# Altium schematic symbol library My Library.SchLib: 1211 symbols (part 6 of 12)
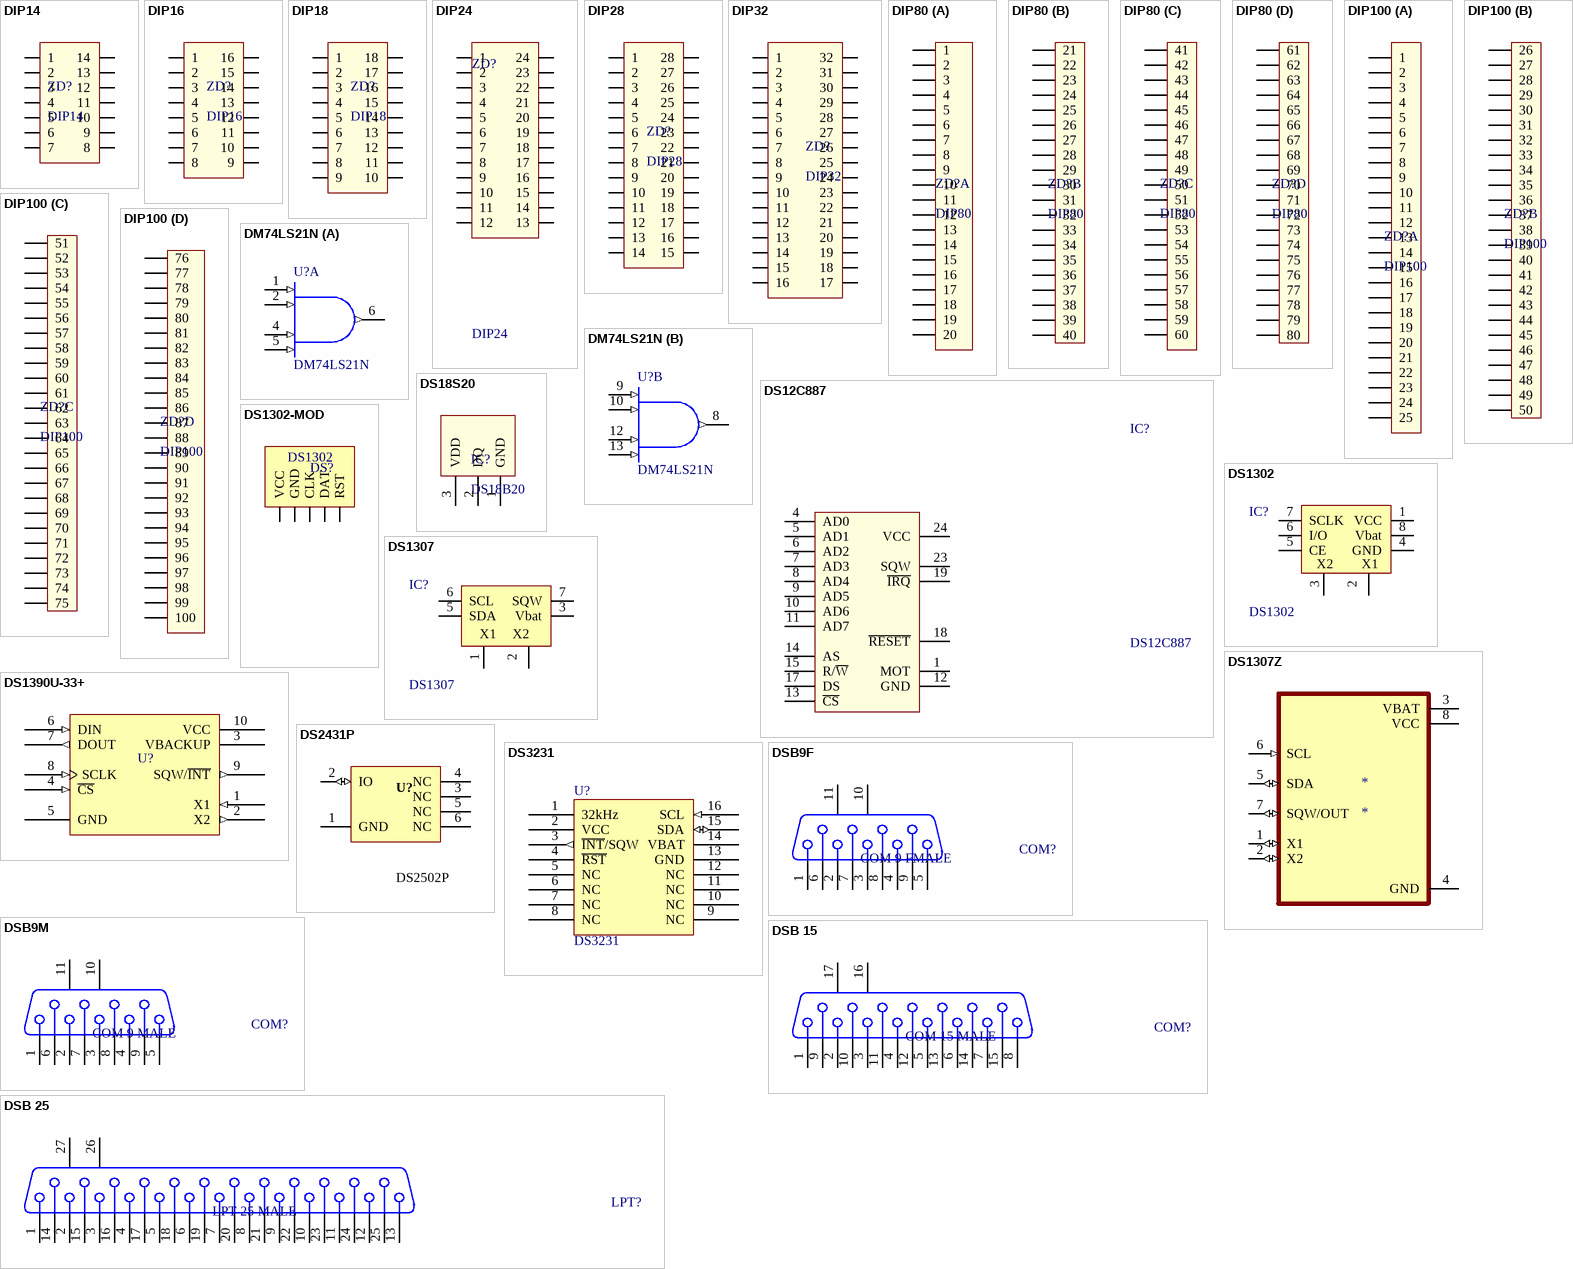
[diagram p77: symbols DIP14 to DSB 25]

## DSB 25
designator LPT?, comment LPT 25 MALE
LPT 25; PackageDocument: U; Positions: 25; Gender: Receptacle; Value: LPT 25; Published: 15-Jun-2001; LatestRevisionDate: 17-Jul-2002; LatestRevisionNote: Re-released for DXP Platform.; DatasheetDocument: 19-Mar-1999; PackageReference: 787202; Publisher: Altium Limited; Orientation: Right Angle
footprint DSB 25-F (LPT FMALE - D Subminiature; 25 Position; Right Angle; Pitch 1.385 mm)
signal-integrity model Connector
footprint DSB 25F-SM (25 pin, connector LPT)
footprint DSB 25-M (LPT MALE D Subminiature; 25 Position; Right Angle; Pitch 1.385 mm)
pins: 1, 2, 3, 4, 5, 6, 7, 8, 9, 10, 11, 12, 13, 14, 15, 16, 17, 18, 19, 20, 21, 22, 23, 24, 25, 26 MH1, 27 MH2

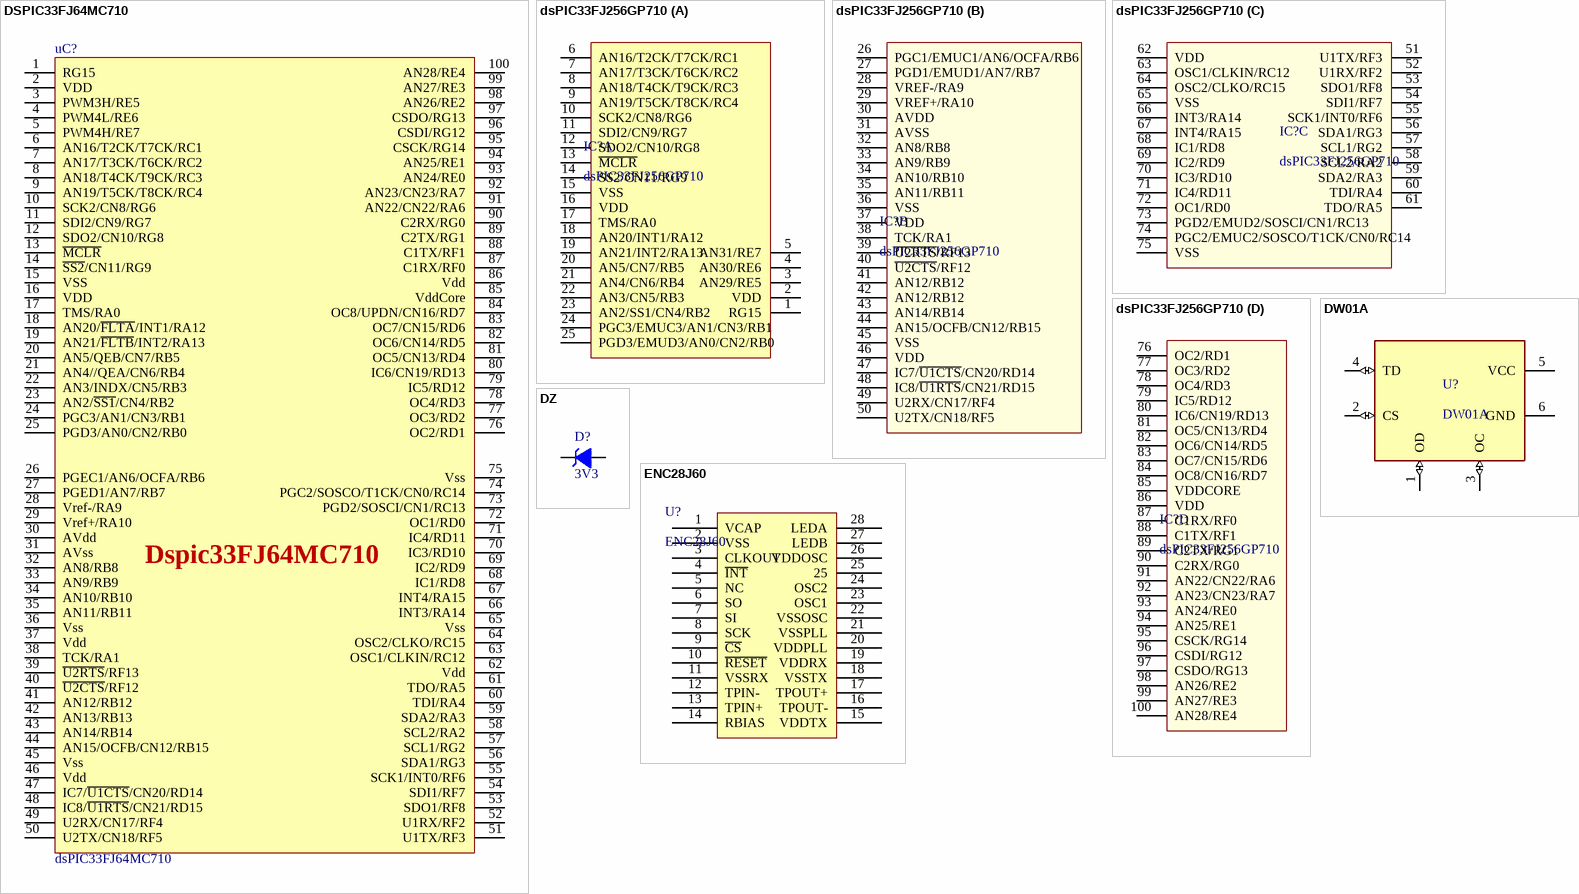
[diagram p33: symbols DSPIC33FJ64MC710 to ENC28J60]

## DSPIC33FJ64MC710
designator uC?, comment dsPIC33FJ64MC710
dsPIC33FJ64/128/256_MC710
footprint SQFP12X12-100(N)
footprint SQFP14X14-100(N)
footprint TQFP-100-12X12 (Shrink QFP, 100-Leads, Body 12x12mm, Pitch 0.4mm, IPC High Density)
pins: 1 RG15, 2 VDD, 3 PWM3H/RE5, 4 PWM4L/RE6, 5 PWM4H/RE7, 6 AN16/T2CK/T7CK/RC1, 7 AN17/T3CK/T6CK/RC2, 8 AN18/T4CK/T9CK/RC3, 9 AN19/T5CK/T8CK/RC4, 10 SCK2/CN8/RG6, 11 SDI2/CN9/RG7, 12 SDO2/CN10/RG8, 13 ~{MCLR}, 14 ~{SS2}/CN11/RG9, 15 VSS, 16 VDD, 17 TMS/RA0, 18 AN20/~{FLTA}/INT1/RA12, 19 AN21/~{FLTB}/INT2/RA13, 20 AN5/QEB/CN7/RB5, 21 AN4//QEA/CN6/RB4, 22 AN3/INDX/CN5/RB3, 23 AN2/~{SS1}/CN4/RB2, 24 PGC3/AN1/CN3/RB1, 25 PGD3/AN0/CN2/RB0, 26 PGEC1/AN6/OCFA/RB6, 27 PGED1/AN7/RB7, 28 Vref-/RA9, 29 Vref+/RA10, 30 AVdd, 31 AVss, 32 AN8/RB8, 33 AN9/RB9, 34 AN10/RB10, 35 AN11/RB11, 36 Vss, 37 Vdd, 38 TCK/RA1, 39 ~{U2RTS}/RF13, 40 ~{U2CTS}/RF12, 41 AN12/RB12, 42 AN13/RB13, 43 AN14/RB14, 44 AN15/OCFB/CN12/RB15, 45 Vss, 46 Vdd, 47 IC7/~{U1CTS}/CN20/RD14, 48 IC8/~{U1RTS}/CN21/RD15, 49 U2RX/CN17/RF4, 50 U2TX/CN18/RF5, 51 U1TX/RF3, 52 U1RX/RF2, 53 SDO1/RF8, 54 SDI1/RF7, 55 SCK1/INT0/RF6, 56 SDA1/RG3, 57 SCL1/RG2, 58 SCL2/RA2, 59 SDA2/RA3, 60 TDI/RA4, 61 TDO/RA5, 62 Vdd, 63 OSC1/CLKIN/RC12, 64 OSC2/CLKO/RC15, 65 Vss, 66 INT3/RA14, 67 INT4/RA15, 68 IC1/RD8, 69 IC2/RD9, 70 IC3/RD10, 71 IC4/RD11, 72 OC1/RD0, 73 PGD2/SOSCI/CN1/RC13, 74 PGC2/SOSCO/T1CK/CN0/RC14, 75 Vss, 76 OC2/RD1, 77 OC3/RD2, 78 OC4/RD3, 79 IC5/RD12, 80 IC6/CN19/RD13, 81 OC5/CN13/RD4, 82 OC6/CN14/RD5, 83 OC7/CN15/RD6, 84 OC8/UPDN/CN16/RD7, 85 VddCore, 86 Vdd, 87 C1RX/RF0, 88 C1TX/RF1, 89 C2TX/RG1, 90 C2RX/RG0, 91 AN22/CN22/RA6, 92 AN23/CN23/RA7, 93 AN24/RE0, 94 AN25/RE1, 95 CSCK/RG14, 96 CSDI/RG12, 97 CSDO/RG13, 98 AN26/RE2, 99 AN27/RE3, 100 AN28/RE4
text: Dspic33FJ64MC710

## dsPIC33FJ256GP710
designator IC?
PIC33FJ256GP710; Value: DIP100
footprint TQFP100L (TQFP, 100-Leads, Body 14.00x14.00mm, Pitch 0.50mm, IPC High Density)
part A pins: 1 RG15, 2 VDD, 3 AN29/RE5, 4 AN30/RE6, 5 AN31/RE7, 6 AN16/T2CK/T7CK/RC1, 7 AN17/T3CK/T6CK/RC2, 8 AN18/T4CK/T9CK/RC3, 9 AN19/T5CK/T8CK/RC4, 10 SCK2/CN8/RG6, 11 SDI2/CN9/RG7, 12 SDO2/CN10/RG8, 13 ~{MCLR}, 14 SS2/CN11/RG9, 15 VSS, 16 VDD, 17 TMS/RA0, 18 AN20/INT1/RA12, 19 AN21/INT2/RA13, 20 AN5/CN7/RB5, 21 AN4/CN6/RB4, 22 AN3/CN5/RB3, 23 AN2/SS1/CN4/RB2, 24 PGC3/EMUC3/AN1/CN3/RB1, 25 PGD3/EMUD3/AN0/CN2/RB0
part B pins: 26 PGC1/EMUC1/AN6/OCFA/RB6, 27 PGD1/EMUD1/AN7/RB7, 28 VREF-/RA9, 29 VREF+/RA10, 30 AVDD, 31 AVSS, 32 AN8/RB8, 33 AN9/RB9, 34 AN10/RB10, 35 AN11/RB11, 36 VSS, 37 VDD, 38 TCK/RA1, 39 ~{U2RTS}/RF13, 40 ~{U2CTS}/RF12, 41 AN12/RB12, 42 AN12/RB12, 43 AN14/RB14, 44 AN15/OCFB/CN12/RB15, 45 VSS, 46 VDD, 47 IC7/~{U1CTS}/CN20/RD14, 48 IC8/~{U1RTS}/CN21/RD15, 49 U2RX/CN17/RF4, 50 U2TX/CN18/RF5
part C pins: 51 U1TX/RF3, 52 U1RX/RF2, 53 SDO1/RF8, 54 SDI1/RF7, 55 SCK1/INT0/RF6, 56 SDA1/RG3, 57 SCL1/RG2, 58 SCL2/RA2, 59 SDA2/RA3, 60 TDI/RA4, 61 TDO/RA5, 62 VDD, 63 OSC1/CLKIN/RC12, 64 OSC2/CLKO/RC15, 65 VSS, 66 INT3/RA14, 67 INT4/RA15, 68 IC1/RD8, 69 IC2/RD9, 70 IC3/RD10, 71 IC4/RD11, 72 OC1/RD0, 73 PGD2/EMUD2/SOSCI/CN1/RC13, 74 PGC2/EMUC2/SOSCO/T1CK/CN0/RC14, 75 VSS
part D pins: 76 OC2/RD1, 77 OC3/RD2, 78 OC4/RD3, 79 IC5/RD12, 80 IC6/CN19/RD13, 81 OC5/CN13/RD4, 82 OC6/CN14/RD5, 83 OC7/CN15/RD6, 84 OC8/CN16/RD7, 85 VDDCORE, 86 VDD, 87 C1RX/RF0, 88 C1TX/RF1, 89 C2TX/RG1, 90 C2RX/RG0, 91 AN22/CN22/RA6, 92 AN23/CN23/RA7, 93 AN24/RE0, 94 AN25/RE1, 95 CSCK/RG14, 96 CSDI/RG12, 97 CSDO/RG13, 98 AN26/RE2, 99 AN27/RE3, 100 AN28/RE4

## DW01A
designator U?
One Cell Lithium-ion/Polymer Battery Protection IC
footprint SOT23-6 (SOT23, 5-Leads, Body 3.0x3.0mm (max), Pitch 0.95mm, IPC Medium Density)
pins: 1 OD (io), 2 CS (io), 3 OC (io), 4 TD (io), 5 VCC (power), 6 GND (power)

## DZ
designator D?, comment 3V3
Diode Zenner; Value: 3v3
footprint DZ0.5A (Diode Zenner, W 80mil, L 300mil)
footprint DZ5A (Diode 5A, W 200mil, L 550mil)
footprint DZ1A (Diode 1A, W 100mil, L 350mil)
footprint DZ2A (Diode 2A, W 150mil, L 450mil)
pins: 1 A, 2 K

## ENC28J60
designator U?
Stand-Alone Ethernet Controller with SPI Interface
footprint DIP28 (28 PIN, W 300mil, Pin to pin 100mil)
footprint SO28 (SOIC, 28-Leads, Body 18.00x7.50mm, Pitch 1.27mm, IPC Medium Density)
footprint TSSOP28 (TSSOP, 28-Leads, Body 10.20x5.30mm, Pitch 0.65mm, IPC High Density)
pins: 1 VCAP, 2 VSS, 3 CLKOUT, 4 ~{INT}, 5 NC, 6 SO, 7 SI, 8 SCK, 9 ~{CS}, 10 ~{RESET}, 11 VSSRX, 12 TPIN-, 13 TPIN+, 14 RBIAS, 15 VDDTX, 16 TPOUT-, 17 TPOUT+, 18 VSSTX, 19 VDDRX, 20 VDDPLL, 21 VSSPLL, 22 VSSOSC, 23 OSC1, 24 OSC2, 25, 26 VDDOSC, 27 LEDB, 28 LEDA

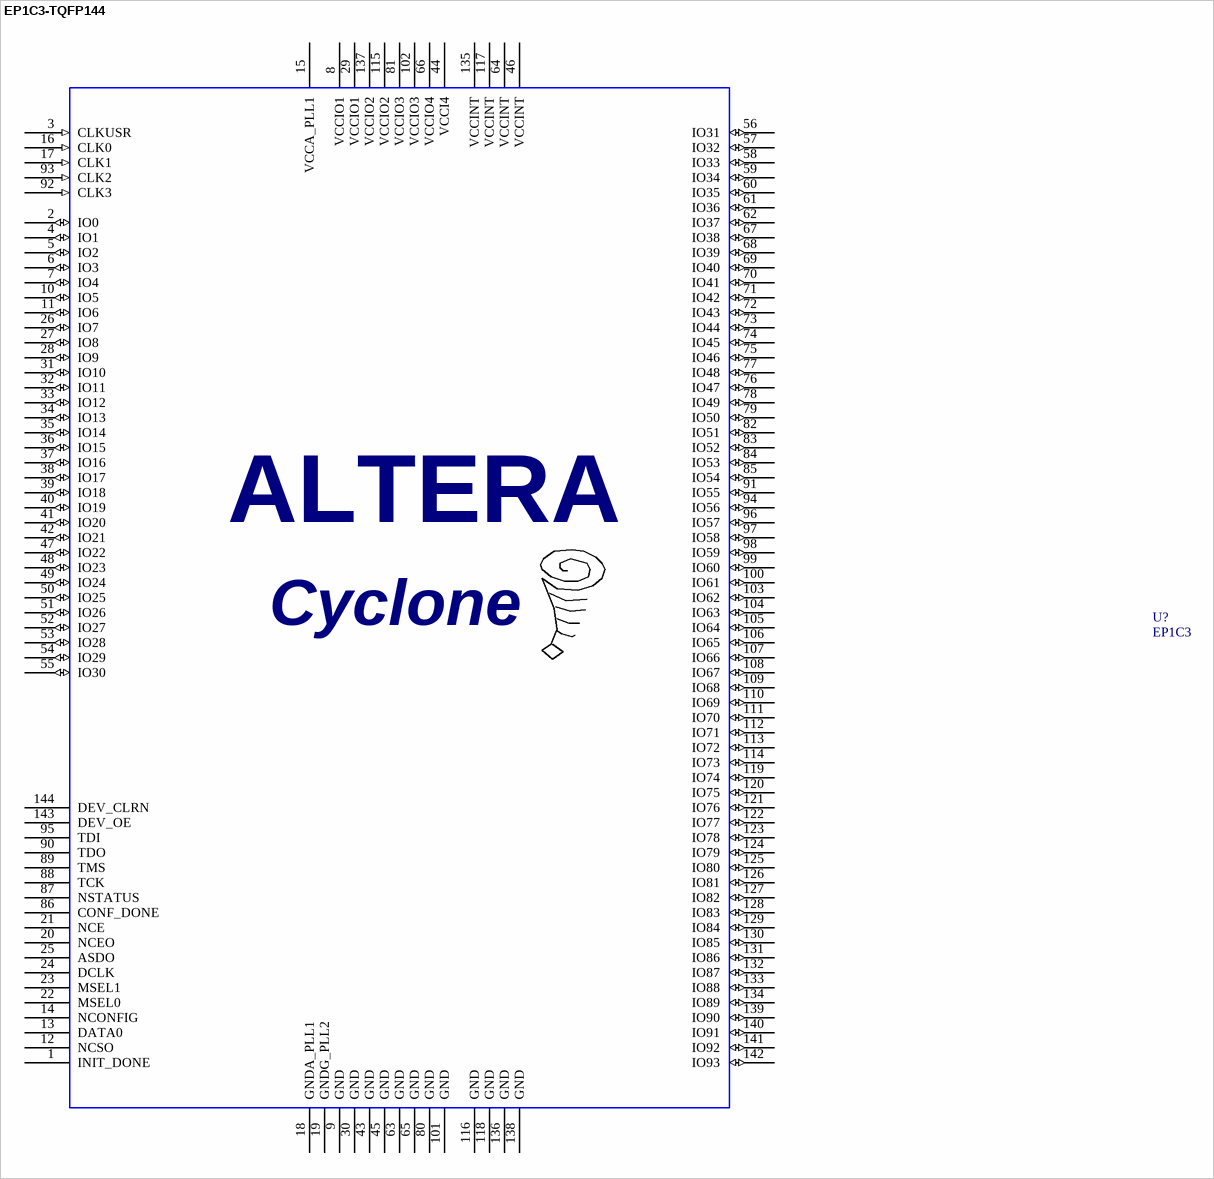
[diagram p34: symbol EP1C3-TQFP144]

## EP1C3-TQFP144
designator U?, comment EP1C3
ALTERA CYCLONE EP1C3 144 TQFP; Manufacturer Part Number: EP1C3T144C6N; Number of Registers: 2910; Number of I /O: 104; Voltage - Supply: 1.4 V ~ 3.6 V; Supplier 1: Digi-Key; Supplier Part Number 1: 544-1662-ND; Operating Temperature: 0°C ~ 85°C; Supplier: Digi-Key; Package / Case: 144-TQFP, 144-VQFP; RoHS: RoHS Compliant; Supplier Part Number: 544-1662-ND; Delay Time: -; Number of Logic Blocks/Elements: 2910; Category: Integrated Circuits (ICs); Number of Gates: -; Manufacturer: Altera
footprint TQFP144
pins: 1 INIT_DONE, 2 IO0 (io), 3 CLKUSR (in), 4 IO1 (io), 5 IO2 (io), 6 IO3 (io), 7 IO4 (io), 8 VCCIO1 (power), 9 GND (power), 10 IO5 (io), 11 IO6 (io), 12 NCSO, 13 DATA0, 14 NCONFIG, 15 VCCA_PLL1 (power), 16 CLK0 (in), 17 CLK1 (in), 18 GNDA_PLL1 (power), 19 GNDG_PLL2 (power), 20 NCEO, 21 NCE, 22 MSEL0, 23 MSEL1, 24 DCLK, 25 ASDO, 26 IO7 (io), 27 IO8 (io), 28 IO9 (io), 29 VCCIO1 (power), 30 GND (power), 31 IO10 (io), 32 IO11 (io), 33 IO12 (io), 34 IO13 (io), 35 IO14 (io), 36 IO15 (io), 37 IO16 (io), 38 IO17 (io), 39 IO18 (io), 40 IO19 (io), 41 IO20 (io), 42 IO21 (io), 43 GND (power), 44 VCCI4 (power), 45 GND (power), 46 VCCINT (power), 47 IO22 (io), 48 IO23 (io), 49 IO24 (io), 50 IO25 (io), 51 IO26 (io), 52 IO27 (io), 53 IO28 (io), 54 IO29 (io), 55 IO30 (io), 56 IO31 (io), 57 IO32 (io), 58 IO33 (io), 59 IO34 (io), 60 IO35 (io), 61 IO36 (io), 62 IO37 (io), 63 GND (power), 64 VCCINT (power), 65 GND (power), 66 VCCIO4 (power), 67 IO38 (io), 68 IO39 (io), 69 IO40 (io), 70 IO41 (io), 71 IO42 (io), 72 IO43 (io), 73 IO44 (io), 74 IO45 (io), 75 IO46 (io), 76 IO47 (io), 77 IO48 (io), 78 IO49 (io), 79 IO50 (io), 80 GND (power), 81 VCCIO3 (power), 82 IO51 (io), 83 IO52 (io), 84 IO53 (io), 85 IO54 (io), 86 CONF_DONE, 87 NSTATUS, 88 TCK, 89 TMS, 90 TDO, 91 IO55 (io), 92 CLK3 (in), 93 CLK2 (in), 94 IO56 (io), 95 TDI, 96 IO57 (io), 97 IO58 (io), 98 IO59 (io), 99 IO60 (io), 100 IO61 (io), 101 GND (power), 102 VCCIO3 (power), 103 IO62 (io), 104 IO63 (io), 105 IO64 (io), 106 IO65 (io), 107 IO66 (io), 108 IO67 (io), 109 IO68 (io), 110 IO69 (io), 111 IO70 (io), 112 IO71 (io), 113 IO72 (io), 114 IO73 (io), 115 VCCIO2 (power), 116 GND (power), 117 VCCINT (power), 118 GND (power), 119 IO74 (io), 120 IO75 (io), 121 IO76 (io), 122 IO77 (io), 123 IO78 (io), 124 IO79 (io), 125 IO80 (io), 126 IO81 (io), 127 IO82 (io), 128 IO83 (io), 129 IO84 (io), 130 IO85 (io), 131 IO86 (io), 132 IO87 (io), 133 IO88 (io), 134 IO89 (io), 135 VCCINT (power), 136 GND (power), 137 VCCIO2 (power), 138 GND (power), 139 IO90 (io), 140 IO91 (io), 141 IO92 (io), 142 IO93 (io), 143 DEV_OE, 144 DEV_CLRN
text: ALTERA; Cyclone

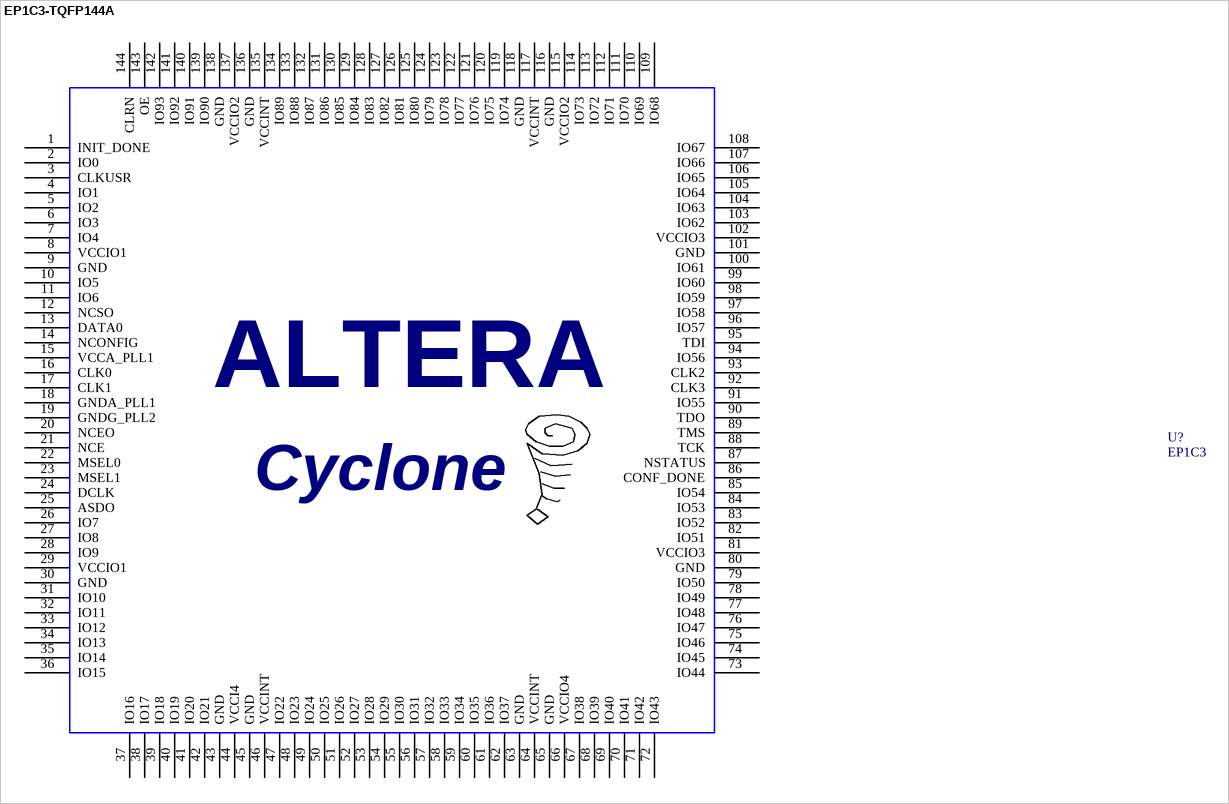
[diagram p35: symbol EP1C3-TQFP144A]

## EP1C3-TQFP144A
designator U?, comment EP1C3
ALTERA CYCLONE EP1C3 144 TQFP; Manufacturer Part Number: EP1C3T144C6N; Number of Registers: 2910; Number of I /O: 104; Voltage - Supply: 1.4 V ~ 3.6 V; Supplier 1: Digi-Key; Supplier Part Number 1: 544-1662-ND; Operating Temperature: 0°C ~ 85°C; Supplier: Digi-Key; Package / Case: 144-TQFP, 144-VQFP; RoHS: RoHS Compliant; Supplier Part Number: 544-1662-ND; Delay Time: -; Number of Logic Blocks/Elements: 2910; Category: Integrated Circuits (ICs); Number of Gates: -; Manufacturer: Altera
footprint TQFP144
pins: 1 INIT_DONE, 2 IO0, 3 CLKUSR, 4 IO1, 5 IO2, 6 IO3, 7 IO4, 8 VCCIO1, 9 GND, 10 IO5, 11 IO6, 12 NCSO, 13 DATA0, 14 NCONFIG, 15 VCCA_PLL1, 16 CLK0, 17 CLK1, 18 GNDA_PLL1, 19 GNDG_PLL2, 20 NCEO, 21 NCE, 22 MSEL0, 23 MSEL1, 24 DCLK, 25 ASDO, 26 IO7, 27 IO8, 28 IO9, 29 VCCIO1, 30 GND, 31 IO10, 32 IO11, 33 IO12, 34 IO13, 35 IO14, 36 IO15, 37 IO16, 38 IO17, 39 IO18, 40 IO19, 41 IO20, 42 IO21, 43 GND, 44 VCCI4, 45 GND, 46 VCCINT, 47 IO22, 48 IO23, 49 IO24, 50 IO25, 51 IO26, 52 IO27, 53 IO28, 54 IO29, 55 IO30, 56 IO31, 57 IO32, 58 IO33, 59 IO34, 60 IO35, 61 IO36, 62 IO37, 63 GND, 64 VCCINT, 65 GND, 66 VCCIO4, 67 IO38, 68 IO39, 69 IO40, 70 IO41, 71 IO42, 72 IO43, 73 IO44, 74 IO45, 75 IO46, 76 IO47, 77 IO48, 78 IO49, 79 IO50, 80 GND, 81 VCCIO3, 82 IO51, 83 IO52, 84 IO53, 85 IO54, 86 CONF_DONE, 87 NSTATUS, 88 TCK, 89 TMS, 90 TDO, 91 IO55, 92 CLK3, 93 CLK2, 94 IO56, 95 TDI, 96 IO57, 97 IO58, 98 IO59, 99 IO60, 100 IO61, 101 GND, 102 VCCIO3, 103 IO62, 104 IO63, 105 IO64, 106 IO65, 107 IO66, 108 IO67, 109 IO68, 110 IO69, 111 IO70, 112 IO71, 113 IO72, 114 IO73, 115 VCCIO2, 116 GND, 117 VCCINT, 118 GND, 119 IO74, 120 IO75, 121 IO76, 122 IO77, 123 IO78, 124 IO79, 125 IO80, 126 IO81, 127 IO82, 128 IO83, 129 IO84, 130 IO85, 131 IO86, 132 IO87, 133 IO88, 134 IO89, 135 VCCINT, 136 GND, 137 VCCIO2, 138 GND, 139 IO90, 140 IO91, 141 IO92, 142 IO93, 143 OE, 144 CLRN
text: ALTERA; Cyclone

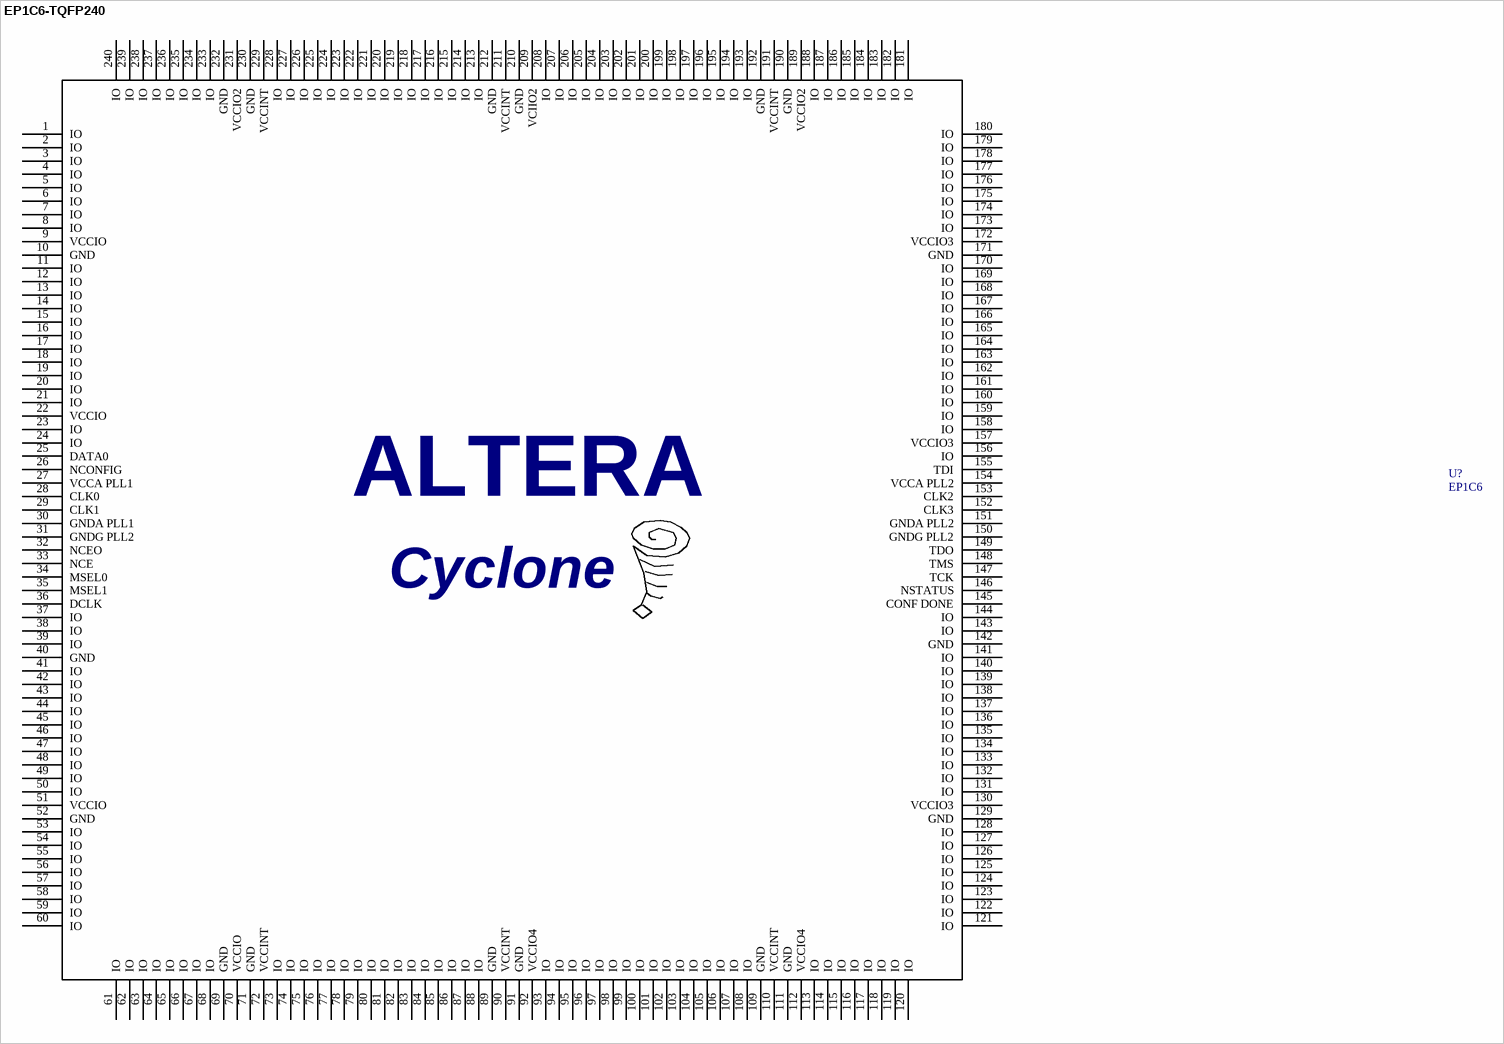
[diagram p36: symbol EP1C6-TQFP240]

## EP1C6-TQFP240
designator U?, comment EP1C6
ALTERA CYCLONE EP1C6 QFP 240; Manufacturer Part Number: EP1C6Q240I7; Number of Logic Blocks/Elements: 5980; Number of I /O: 185; Voltage - Supply: 1.4 V ~ 3.6 V; Supplier 1: Digi-Key; Supplier Part Number 1: 544-1086-ND; Package / Case: 240-MQFP, 240-PQFP; Category: Integrated Circuits (ICs); Supplier: Digi-Key; Manufacturer: Altera; Operating Temperature: -40°C ~ 100°C; Number of Registers: 5980; Supplier Part Number: 544-1086-ND; Delay Time: -; Number of Gates: -; RoHS: RoHS non-compliant
footprint QFP240
pins: 1 IO, 2 IO, 3 IO, 4 IO, 5 IO, 6 IO, 7 IO, 8 IO, 9 VCCIO, 10 GND, 11 IO, 12 IO, 13 IO, 14 IO, 15 IO, 16 IO, 17 IO, 18 IO, 19 IO, 20 IO, 21 IO, 22 VCCIO, 23 IO, 24 IO, 25 DATA0, 26 NCONFIG, 27 VCCA PLL1, 28 CLK0, 29 CLK1, 30 GNDA PLL1, 31 GNDG PLL2, 32 NCEO, 33 NCE, 34 MSEL0, 35 MSEL1, 36 DCLK, 37 IO, 38 IO, 39 IO, 40 GND, 41 IO, 42 IO, 43 IO, 44 IO, 45 IO, 46 IO, 47 IO, 48 IO, 49 IO, 50 IO, 51 VCCIO, 52 GND, 53 IO, 54 IO, 55 IO, 56 IO, 57 IO, 58 IO, 59 IO, 60 IO, 61 IO, 62 IO, 63 IO, 64 IO, 65 IO, 66 IO, 67 IO, 68 IO, 69 GND, 70 VCCIO, 71 GND, 72 VCCINT, 73 IO, 74 IO, 75 IO, 76 IO, 77 IO, 78 IO, 79 IO, 80 IO, 81 IO, 82 IO, 83 IO, 84 IO, 85 IO, 86 IO, 87 IO, 88 IO, 89 GND, 90 VCCINT, 91 GND, 92 VCCIO4, 93 IO, 94 IO, 95 IO, 96 IO, 97 IO, 98 IO, 99 IO, 100 IO, 101 IO, 102 IO, 103 IO, 104 IO, 105 IO, 106 IO, 107 IO, 108 IO, 109 GND, 110 VCCINT, 111 GND, 112 VCCIO4, 113 IO, 114 IO, 115 IO, 116 IO, 117 IO, 118 IO, 119 IO, 120 IO, 121 IO, 122 IO, 123 IO, 124 IO, 125 IO, 126 IO, 127 IO, 128 IO, 129 GND, 130 VCCIO3, 131 IO, 132 IO, 133 IO, 134 IO, 135 IO, 136 IO, 137 IO, 138 IO, 139 IO, 140 IO, 141 IO, 142 GND, 143 IO, 144 IO, 145 CONF DONE, 146 NSTATUS, 147 TCK, 148 TMS, 149 TDO, 150 GNDG PLL2, 151 GNDA PLL2, 152 CLK3, 153 CLK2, 154 VCCA PLL2, 155 TDI, 156 IO, 157 VCCIO3, 158 IO, 159 IO, 160 IO, 161 IO, 162 IO, 163 IO, 164 IO, 165 IO, 166 IO, 167 IO, 168 IO, 169 IO, 170 IO, 171 GND, 172 VCCIO3, 173 IO, 174 IO, 175 IO, 176 IO, 177 IO, 178 IO, 179 IO, 180 IO, 181 IO, 182 IO, 183 IO, 184 IO, 185 IO, 186 IO, 187 IO, 188 IO, 189 VCCIO2, 190 GND, 191 VCCINT, 192 GND, 193 IO, 194 IO, 195 IO, 196 IO, 197 IO, 198 IO, 199 IO, 200 IO, 201 IO, 202 IO, 203 IO, 204 IO, 205 IO, 206 IO, 207 IO, 208 IO, 209 VCIIO2, 210 GND, 211 VCCINT, 212 GND, 213 IO, 214 IO, 215 IO, 216 IO, 217 IO, 218 IO, 219 IO, 220 IO, 221 IO, 222 IO, 223 IO, 224 IO, 225 IO, 226 IO, 227 IO, 228 IO, 229 VCCINT, 230 GND, 231 VCCIO2, 232 GND, 233 IO, 234 IO, 235 IO, 236 IO, 237 IO, 238 IO, 239 IO, 240 IO
